# Altium integrated library 860010374011_Altium_WCAP-ATG8_rev19a.IntLib: 195 symbols (part 1 of 2)
Pins are listed as number, name and electrical type; pins without a type are passive.

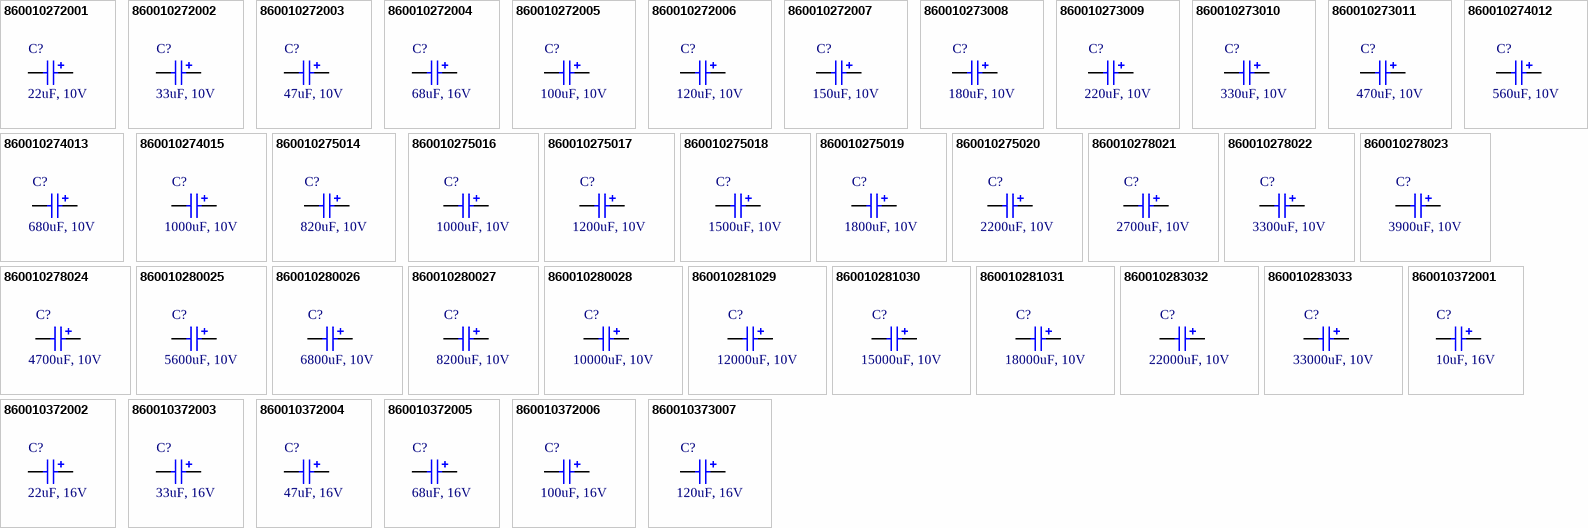
[diagram p0: symbols 860010272001 to 860010373007]

## 860010272001
designator C?, comment 22uF, 10V
WCAP-ATG8 THT Aluminum Electrolytic Capacitors, D5mm x L11mm, 22uF, +/-20%, 10VDC; Part Number: 860010272001; Dissipation Factor: 19%; Endurance: 2000h; Leakage Current: 3uA; Ripple Current max.: 66mA; Technical Reference: ATBC110220M010DSPA3B000; ComponentLink1Description: Manufacturer; ComponentLink1URL: http://www.we-online.de; ComponentLink2Description: Datasheet; ComponentLink2URL: https://katalog.we-online.com/pbs/datasheet/860010272001.pdf; Length: 11mm; Mounting Technology: THT; Operating Temperature: -40 to +85degC; Packaging: Ammo Pack; Published Date: August 2019; Capacitance: 22uF; Diameter: 5mm; Publisher: Wurth Elektronik; Capacitance Tolerance: +/-20%; Rated Voltage: 10VDC
footprint WCAP-ATG8_5x11
pins: 1 N, 2 P

## 860010272002
designator C?, comment 33uF, 10V
WCAP-ATG8 THT Aluminum Electrolytic Capacitors, D5mm x L11mm, 33uF, +/-20%, 10VDC; Part Number: 860010272002; Dissipation Factor: 19%; Endurance: 2000h; Leakage Current: 3.3uA; Ripple Current max.: 88mA; Technical Reference: ATBC110330M010DSPA3B000; ComponentLink1Description: Manufacturer; ComponentLink1URL: http://www.we-online.de; ComponentLink2Description: Datasheet; ComponentLink2URL: https://katalog.we-online.com/pbs/datasheet/860010272002.pdf; Length: 11mm; Mounting Technology: THT; Operating Temperature: -40 to +85degC; Packaging: Ammo Pack; Published Date: August 2019; Capacitance: 33uF; Diameter: 5mm; Publisher: Wurth Elektronik; Capacitance Tolerance: +/-20%; Rated Voltage: 10VDC
footprint WCAP-ATG8_5x11
pins: 1 N, 2 P

## 860010272003
designator C?, comment 47uF, 10V
WCAP-ATG8 THT Aluminum Electrolytic Capacitors, D5mm x L11mm, 47uF, +/-20%, 10VDC; Part Number: 860010272003; Dissipation Factor: 19%; Endurance: 2000h; Leakage Current: 4.7uA; Ripple Current max.: 105mA; Technical Reference: ATBC110470M010DSPA3B000; ComponentLink1Description: Manufacturer; ComponentLink1URL: http://www.we-online.de; ComponentLink2Description: Datasheet; ComponentLink2URL: https://katalog.we-online.com/pbs/datasheet/860010272003.pdf; Length: 11mm; Mounting Technology: THT; Operating Temperature: -40 to +85degC; Packaging: Ammo Pack; Published Date: August 2019; Capacitance: 47uF; Diameter: 5mm; Publisher: Wurth Elektronik; Capacitance Tolerance: +/-20%; Rated Voltage: 10VDC
footprint WCAP-ATG8_5x11
pins: 1 N, 2 P

## 860010272004
designator C?, comment 68uF, 16V
WCAP-ATG8 THT Aluminum Electrolytic Capacitors, D5mm x L11mm, 68uF, +/-20%, 10VDC; Part Number: 860010372005; Dissipation Factor: 16%; Endurance: 2000h; Leakage Current: 10.88uA; Ripple Current max.: 149mA; Rated Voltage: 16VDC; Technical Reference: ATBC110680M016DSPA3B000; ComponentLink1Description: Manufacturer; ComponentLink1URL: http://www.we-online.de; ComponentLink2Description: Datasheet; ComponentLink2URL: https://katalog.we-online.com/pbs/datasheet/860010372005.pdf; Length: 11mm; Mounting Technology: THT; Operating Temperature: -40 to +85degC; Packaging: Ammo Pack; Published Date: August 2019; Capacitance: 68uF; Diameter: 5mm; Publisher: Wurth Elektronik; Capacitance Tolerance: +/-20%
footprint WCAP-ATG8_5x11
pins: 1 N, 2 P

## 860010272005
designator C?, comment 100uF, 10V
WCAP-ATG8 THT Aluminum Electrolytic Capacitors, D5mm x L11mm, 100uF, +/-20%, 10VDC; Part Number: 860010272005; Dissipation Factor: 19%; Endurance: 2000h; Leakage Current: 10uA; Ripple Current max.: 198mA; Technical Reference: ATBC110101M010DSPA3B000; ComponentLink1Description: Manufacturer; ComponentLink1URL: http://www.we-online.de; ComponentLink2Description: Datasheet; ComponentLink2URL: https://katalog.we-online.com/pbs/datasheet/860010272005.pdf; Length: 11mm; Mounting Technology: THT; Operating Temperature: -40 to +85degC; Packaging: Ammo Pack; Published Date: August 2019; Capacitance: 100uF; Diameter: 5mm; Publisher: Wurth Elektronik; Capacitance Tolerance: +/-20%; Rated Voltage: 10VDC
footprint WCAP-ATG8_5x11
pins: 1 N, 2 P

## 860010272006
designator C?, comment 120uF, 10V
WCAP-ATG8 THT Aluminum Electrolytic Capacitors, D5mm x L11mm, 120uF, +/-20%, 10VDC; Part Number: 860010272006; Dissipation Factor: 19%; Endurance: 2000h; Leakage Current: 12uA; Ripple Current max.: 209mA; Technical Reference: ATBC110121M010DSPA3B000; ComponentLink1Description: Manufacturer; ComponentLink1URL: http://www.we-online.de; ComponentLink2Description: Datasheet; ComponentLink2URL: https://katalog.we-online.com/pbs/datasheet/860010272006.pdf; Length: 11mm; Mounting Technology: THT; Operating Temperature: -40 to +85degC; Packaging: Ammo Pack; Published Date: August 2019; Capacitance: 120uF; Diameter: 5mm; Publisher: Wurth Elektronik; Capacitance Tolerance: +/-20%; Rated Voltage: 10VDC
footprint WCAP-ATG8_5x11
pins: 1 N, 2 P

## 860010272007
designator C?, comment 150uF, 10V
WCAP-ATG8 THT Aluminum Electrolytic Capacitors, D5mm x L11mm, 150uF, +/-20%, 10VDC; Part Number: 860010272007; Dissipation Factor: 19%; Endurance: 2000h; Leakage Current: 15uA; Ripple Current max.: 231mA; Technical Reference: ATBC110151M010DSPA3B000; ComponentLink1Description: Manufacturer; ComponentLink1URL: http://www.we-online.de; ComponentLink2Description: Datasheet; ComponentLink2URL: https://katalog.we-online.com/pbs/datasheet/860010272007.pdf; Length: 11mm; Mounting Technology: THT; Operating Temperature: -40 to +85degC; Packaging: Ammo Pack; Published Date: August 2019; Capacitance: 150uF; Diameter: 5mm; Publisher: Wurth Elektronik; Capacitance Tolerance: +/-20%; Rated Voltage: 10VDC
footprint WCAP-ATG8_5x11
pins: 1 N, 2 P

## 860010273008
designator C?, comment 180uF, 10V
WCAP-ATG8 THT Aluminum Electrolytic Capacitors, D6.3mm x L11mm, 180uF, +/-20%, 10VDC; Part Number: 860010273008; Dissipation Factor: 19%; Endurance: 2000h; Leakage Current: 18uA; Ripple Current max.: 253mA; Technical Reference: ATBD110181M010DSPA4B000; ComponentLink1Description: Manufacturer; ComponentLink1URL: http://www.we-online.de; ComponentLink2Description: Datasheet; ComponentLink2URL: https://katalog.we-online.com/pbs/datasheet/860010273008.pdf; Length: 11mm; Mounting Technology: THT; Operating Temperature: -40 to +85degC; Packaging: Ammo Pack; Published Date: August 2019; Capacitance: 180uF; Diameter: 6.3mm; Publisher: Wurth Elektronik; Capacitance Tolerance: +/-20%; Rated Voltage: 10VDC
footprint WCAP-ATG8_6.3x11
pins: 1 N, 2 P

## 860010273009
designator C?, comment 220uF, 10V
WCAP-ATG8 THT Aluminum Electrolytic Capacitors, D6.3mm x L11mm, 220uF, +/-20%, 10VDC; Part Number: 860010273009; Dissipation Factor: 19%; Endurance: 2000h; Leakage Current: 22uA; Ripple Current max.: 294mA; Technical Reference: ATBD110221M010DSPA4B000; ComponentLink1Description: Manufacturer; ComponentLink1URL: http://www.we-online.de; ComponentLink2Description: Datasheet; ComponentLink2URL: https://katalog.we-online.com/pbs/datasheet/860010273009.pdf; Length: 11mm; Mounting Technology: THT; Operating Temperature: -40 to +85degC; Packaging: Ammo Pack; Published Date: August 2019; Capacitance: 220uF; Diameter: 6.3mm; Publisher: Wurth Elektronik; Capacitance Tolerance: +/-20%; Rated Voltage: 10VDC
footprint WCAP-ATG8_6.3x11
pins: 1 N, 2 P

## 860010273010
designator C?, comment 330uF, 10V
WCAP-ATG8 THT Aluminum Electrolytic Capacitors, D6.3mm x L11mm, 330uF, +/-20%, 10VDC; Part Number: 860010273010; Dissipation Factor: 19%; Endurance: 2000h; Leakage Current: 33uA; Ripple Current max.: 363mA; Technical Reference: ATBD110331M010DSPA4B000; ComponentLink1Description: Manufacturer; ComponentLink1URL: http://www.we-online.de; ComponentLink2Description: Datasheet; ComponentLink2URL: https://katalog.we-online.com/pbs/datasheet/860010273010.pdf; Length: 11mm; Mounting Technology: THT; Operating Temperature: -40 to +85degC; Packaging: Ammo Pack; Published Date: August 2019; Capacitance: 330uF; Diameter: 6.3mm; Publisher: Wurth Elektronik; Capacitance Tolerance: +/-20%; Rated Voltage: 10VDC
footprint WCAP-ATG8_6.3x11
pins: 1 N, 2 P

## 860010273011
designator C?, comment 470uF, 10V
WCAP-ATG8 THT Aluminum Electrolytic Capacitors, D6.3mm x L11mm, 470uF, +/-20%, 10VDC; Part Number: 860010273011; Dissipation Factor: 19%; Endurance: 2000h; Leakage Current: 47uA; Ripple Current max.: 418mA; Technical Reference: ATBD110471M010DSPA4B000; ComponentLink1Description: Manufacturer; ComponentLink1URL: http://www.we-online.de; ComponentLink2Description: Datasheet; ComponentLink2URL: https://katalog.we-online.com/pbs/datasheet/860010273011.pdf; Length: 11mm; Mounting Technology: THT; Operating Temperature: -40 to +85degC; Packaging: Ammo Pack; Published Date: August 2019; Capacitance: 470uF; Diameter: 6.3mm; Publisher: Wurth Elektronik; Capacitance Tolerance: +/-20%; Rated Voltage: 10VDC
footprint WCAP-ATG8_6.3x11
pins: 1 N, 2 P

## 860010274012
designator C?, comment 560uF, 10V
WCAP-ATG8 THT Aluminum Electrolytic Capacitors, D8mm x L11.5mm, 560uF, +/-20%, 10VDC; Part Number: 860010274012; Dissipation Factor: 19%; Endurance: 2000h; Leakage Current: 56uA; Ripple Current max.: 506mA; Technical Reference: ATBE115561M010DSPA7B000; ComponentLink1Description: Manufacturer; ComponentLink1URL: http://www.we-online.de; ComponentLink2Description: Datasheet; ComponentLink2URL: https://katalog.we-online.com/pbs/datasheet/860010274012.pdf; Length: 11.5mm; Mounting Technology: THT; Operating Temperature: -40 to +85degC; Packaging: Ammo Pack; Published Date: August 2019; Capacitance: 560uF; Diameter: 8mm; Publisher: Wurth Elektronik; Capacitance Tolerance: +/-20%; Rated Voltage: 10VDC
footprint WCAP-ATG8_8x11.5
pins: 1 N, 2 P

## 860010274013
designator C?, comment 680uF, 10V
WCAP-ATG8 THT Aluminum Electrolytic Capacitors, D8mm x L11.5mm, 680uF, +/-20%, 10VDC; Part Number: 860010274013; Dissipation Factor: 19%; Endurance: 2000h; Leakage Current: 68uA; Ripple Current max.: 572mA; Technical Reference: ATBE115681M010DSPA7B000; ComponentLink1Description: Manufacturer; ComponentLink1URL: http://www.we-online.de; ComponentLink2Description: Datasheet; ComponentLink2URL: https://katalog.we-online.com/pbs/datasheet/860010274013.pdf; Length: 11.5mm; Mounting Technology: THT; Operating Temperature: -40 to +85degC; Packaging: Ammo Pack; Published Date: August 2019; Capacitance: 680uF; Diameter: 8mm; Publisher: Wurth Elektronik; Capacitance Tolerance: +/-20%; Rated Voltage: 10VDC
footprint WCAP-ATG8_8x11.5
pins: 1 N, 2 P

## 860010274015
designator C?, comment 1000uF, 10V
WCAP-ATG8 THT Aluminum Electrolytic Capacitors, D8mm x L16mm, 1000uF, +/-20%, 10VDC; Part Number: 860010274015; Dissipation Factor: 19%; Endurance: 2000h; Leakage Current: 100uA; Ripple Current max.: 725mA; Technical Reference: ATBE160102M010DSPA7B000; ComponentLink1Description: Manufacturer; ComponentLink1URL: http://www.we-online.de; ComponentLink2Description: Datasheet; ComponentLink2URL: https://katalog.we-online.com/pbs/datasheet/860010274015.pdf; Length: 16mm; Mounting Technology: THT; Operating Temperature: -40 to +85degC; Packaging: Ammo Pack; Published Date: August 2019; Capacitance: 1000uF; Diameter: 8mm; Publisher: Wurth Elektronik; Capacitance Tolerance: +/-20%; Rated Voltage: 10VDC
footprint WCAP-ATG8_8x16
pins: 1 N, 2 P

## 860010275014
designator C?, comment 820uF, 10V
WCAP-ATG8 THT Aluminum Electrolytic Capacitors, D10mm x L12.5mm, 820uF, +/-20%, 10VDC; Part Number: 860010275014; Dissipation Factor: 19%; Endurance: 2000h; Leakage Current: 82uA; Ripple Current max.: 671mA; Technical Reference: ATBF125821M010DSPA9B000; ComponentLink1Description: Manufacturer; ComponentLink1URL: http://www.we-online.de; ComponentLink2Description: Datasheet; ComponentLink2URL: https://katalog.we-online.com/pbs/datasheet/860010275014.pdf; Length: 12.5mm; Mounting Technology: THT; Operating Temperature: -40 to +85degC; Packaging: Ammo Pack; Published Date: August 2019; Capacitance: 820uF; Diameter: 10mm; Publisher: Wurth Elektronik; Capacitance Tolerance: +/-20%; Rated Voltage: 10VDC
footprint WCAP-ATG8_10x12.5
pins: 1 N, 2 P

## 860010275016
designator C?, comment 1000uF, 10V
WCAP-ATG8 THT Aluminum Electrolytic Capacitors, D10mm x L12.5mm, 1000uF, +/-20%, 10VDC; Part Number: 860010274015; Dissipation Factor: 19%; Endurance: 2000h; Leakage Current: 100uA; Ripple Current max.: 725mA; Technical Reference: ATBE160102M010DSPA7B000; ComponentLink1Description: Manufacturer; ComponentLink1URL: http://www.we-online.de; ComponentLink2Description: Datasheet; ComponentLink2URL: https://katalog.we-online.com/pbs/datasheet/860010274015.pdf; Length: 16mm; Mounting Technology: THT; Operating Temperature: -40 to +85degC; Packaging: Ammo Pack; Published Date: August 2019; Capacitance: 1000uF; Diameter: 8mm; Publisher: Wurth Elektronik; Capacitance Tolerance: +/-20%; Rated Voltage: 10VDC
footprint WCAP-ATG8_10x12.5
pins: 1 N, 2 P

## 860010275017
designator C?, comment 1200uF, 10V
WCAP-ATG8 THT Aluminum Electrolytic Capacitors, D10mm x L16mm, 1200uF, +/-20%, 10VDC; Part Number: 860010275017; Dissipation Factor: 19%; Endurance: 2000h; Leakage Current: 120uA; Ripple Current max.: 902mA; Technical Reference: ATBF160122M010DSPAAB000; ComponentLink1Description: Manufacturer; ComponentLink1URL: http://www.we-online.de; ComponentLink2Description: Datasheet; ComponentLink2URL: https://katalog.we-online.com/pbs/datasheet/860010275017.pdf; Length: 16mm; Mounting Technology: THT; Operating Temperature: -40 to +85degC; Packaging: Ammo Pack; Published Date: August 2019; Capacitance: 1200uF; Diameter: 10mm; Publisher: Wurth Elektronik; Capacitance Tolerance: +/-20%; Rated Voltage: 10VDC
footprint WCAP-ATG8_10x16
pins: 1 N, 2 P

## 860010275018
designator C?, comment 1500uF, 10V
WCAP-ATG8 THT Aluminum Electrolytic Capacitors, D10mm x L16mm, 1500uF, +/-20%, 10VDC; Part Number: 860010275018; Dissipation Factor: 19%; Endurance: 2000h; Leakage Current: 150uA; Ripple Current max.: 1001mA; Technical Reference: ATBF160152M010DSPAAB000; ComponentLink1Description: Manufacturer; ComponentLink1URL: http://www.we-online.de; ComponentLink2Description: Datasheet; ComponentLink2URL: https://katalog.we-online.com/pbs/datasheet/860010275018.pdf; Length: 16mm; Mounting Technology: THT; Operating Temperature: -40 to +85degC; Packaging: Ammo Pack; Published Date: August 2019; Capacitance: 1500uF; Diameter: 10mm; Publisher: Wurth Elektronik; Capacitance Tolerance: +/-20%; Rated Voltage: 10VDC
footprint WCAP-ATG8_10x16
pins: 1 N, 2 P

## 860010275019
designator C?, comment 1800uF, 10V
WCAP-ATG8 THT Aluminum Electrolytic Capacitors, D10mm x L20mm, 1800uF, +/-20%, 10VDC; Part Number: 860010275019; Dissipation Factor: 19%; Endurance: 2000h; Leakage Current: 180uA; Ripple Current max.: 1089mA; Technical Reference: ATBF200182M010DSPAAB000; ComponentLink1Description: Manufacturer; ComponentLink1URL: http://www.we-online.de; ComponentLink2Description: Datasheet; ComponentLink2URL: https://katalog.we-online.com/pbs/datasheet/860010275019.pdf; Length: 20mm; Mounting Technology: THT; Operating Temperature: -40 to +85degC; Packaging: Ammo Pack; Published Date: August 2019; Capacitance: 1800uF; Diameter: 10mm; Publisher: Wurth Elektronik; Capacitance Tolerance: +/-20%; Rated Voltage: 10VDC
footprint WCAP-ATG8_10x20
pins: 1 N, 2 P

## 860010275020
designator C?, comment 2200uF, 10V
WCAP-ATG8 THT Aluminum Electrolytic Capacitors, D10mm x L20mm, 2200uF, +/-20%, 10VDC; Part Number: 860010275020; Dissipation Factor: 21%; Endurance: 2000h; Leakage Current: 220uA; Ripple Current max.: 1210mA; Technical Reference: ATBF200222M010DSPAAB000; ComponentLink1Description: Manufacturer; ComponentLink1URL: http://www.we-online.de; ComponentLink2Description: Datasheet; ComponentLink2URL: https://katalog.we-online.com/pbs/datasheet/860010275020.pdf; Length: 20mm; Mounting Technology: THT; Operating Temperature: -40 to +85degC; Packaging: Ammo Pack; Published Date: August 2019; Capacitance: 2200uF; Diameter: 10mm; Publisher: Wurth Elektronik; Capacitance Tolerance: +/-20%; Rated Voltage: 10VDC
footprint WCAP-ATG8_10x20
pins: 1 N, 2 P

## 860010278021
designator C?, comment 2700uF, 10V
WCAP-ATG8 THT Aluminum Electrolytic Capacitors, D13mm x L20mm, 2700uF, +/-20%, 10VDC; Part Number: 860010278021; Dissipation Factor: 21%; Endurance: 2000h; Leakage Current: 270uA; Ripple Current max.: 1419mA; Technical Reference: ATBI200272M010DSPACB000; ComponentLink1Description: Manufacturer; ComponentLink1URL: http://www.we-online.de; ComponentLink2Description: Datasheet; ComponentLink2URL: https://katalog.we-online.com/pbs/datasheet/860010278021.pdf; Length: 20mm; Mounting Technology: THT; Operating Temperature: -40 to +85degC; Packaging: Ammo Pack; Published Date: August 2019; Capacitance: 2700uF; Diameter: 13mm; Publisher: Wurth Elektronik; Capacitance Tolerance: +/-20%; Rated Voltage: 10VDC
footprint WCAP-ATG8_13x20
pins: 1 N, 2 P

## 860010278022
designator C?, comment 3300uF, 10V
WCAP-ATG8 THT Aluminum Electrolytic Capacitors, D13mm x L20mm, 3300uF, +/-20%, 10VDC; Part Number: 860010278022; Dissipation Factor: 23%; Endurance: 2000h; Leakage Current: 330uA; Ripple Current max.: 1540mA; Technical Reference: ATBI200332M010DSPACB000; ComponentLink1Description: Manufacturer; ComponentLink1URL: http://www.we-online.de; ComponentLink2Description: Datasheet; ComponentLink2URL: https://katalog.we-online.com/pbs/datasheet/860010278022.pdf; Length: 20mm; Mounting Technology: THT; Operating Temperature: -40 to +85degC; Packaging: Ammo Pack; Published Date: August 2019; Capacitance: 3300uF; Diameter: 13mm; Publisher: Wurth Elektronik; Capacitance Tolerance: +/-20%; Rated Voltage: 10VDC
footprint WCAP-ATG8_13x20
pins: 1 N, 2 P

## 860010278023
designator C?, comment 3900uF, 10V
WCAP-ATG8 THT Aluminum Electrolytic Capacitors, D13mm x L20mm, 3900uF, +/-20%, 10VDC; Part Number: 860010278023; Dissipation Factor: 23%; Endurance: 2000h; Leakage Current: 390uA; Ripple Current max.: 1760mA; Technical Reference: ATBI200392M010DSPACB000; ComponentLink1Description: Manufacturer; ComponentLink1URL: http://www.we-online.de; ComponentLink2Description: Datasheet; ComponentLink2URL: https://katalog.we-online.com/pbs/datasheet/860010278023.pdf; Length: 20mm; Mounting Technology: THT; Operating Temperature: -40 to +85degC; Packaging: Ammo Pack; Published Date: August 2019; Capacitance: 3900uF; Diameter: 13mm; Publisher: Wurth Elektronik; Capacitance Tolerance: +/-20%; Rated Voltage: 10VDC
footprint WCAP-ATG8_13x20
pins: 1 N, 2 P

## 860010278024
designator C?, comment 4700uF, 10V
WCAP-ATG8 THT Aluminum Electrolytic Capacitors, D13mm x L25mm, 4700uF, +/-20%, 10VDC; Part Number: 860010278024; Dissipation Factor: 25%; Endurance: 2000h; Leakage Current: 470uA; Ripple Current max.: 1980mA; Technical Reference: ATBI250472M010DSPACB000; ComponentLink1Description: Manufacturer; ComponentLink1URL: http://www.we-online.de; ComponentLink2Description: Datasheet; ComponentLink2URL: https://katalog.we-online.com/pbs/datasheet/860010278024.pdf; Length: 25mm; Mounting Technology: THT; Operating Temperature: -40 to +85degC; Packaging: Ammo Pack; Published Date: August 2019; Capacitance: 4700uF; Diameter: 13mm; Publisher: Wurth Elektronik; Capacitance Tolerance: +/-20%; Rated Voltage: 10VDC
footprint WCAP-ATG8_13x25
pins: 1 N, 2 P

## 860010280025
designator C?, comment 5600uF, 10V
WCAP-ATG8 THT Aluminum Electrolytic Capacitors, D16mm x L25mm, 5600uF, +/-20%, 10VDC; Part Number: 860010280025; Dissipation Factor: 27%; Endurance: 2000h; Leakage Current: 560uA; Ripple Current max.: 2189mA; Technical Reference: ATBK250562M010DSPAEB000; ComponentLink1Description: Manufacturer; ComponentLink1URL: http://www.we-online.de; ComponentLink2Description: Datasheet; ComponentLink2URL: https://katalog.we-online.com/pbs/datasheet/860010280025.pdf; Length: 25mm; Mounting Technology: THT; Operating Temperature: -40 to +85degC; Packaging: Ammo Pack; Published Date: August 2019; Capacitance: 5600uF; Diameter: 16mm; Publisher: Wurth Elektronik; Capacitance Tolerance: +/-20%; Rated Voltage: 10VDC
footprint WCAP-ATG8_16x25
pins: 1 N, 2 P

## 860010280026
designator C?, comment 6800uF, 10V
WCAP-ATG8 THT Aluminum Electrolytic Capacitors, D16mm x L25mm, 6800uF, +/-20%, 10VDC; Part Number: 860010280026; Dissipation Factor: 29%; Endurance: 2000h; Leakage Current: 680uA; Ripple Current max.: 2475mA; Technical Reference: ATBK250682M010DSPAEB000; ComponentLink1Description: Manufacturer; ComponentLink1URL: http://www.we-online.de; ComponentLink2Description: Datasheet; ComponentLink2URL: https://katalog.we-online.com/pbs/datasheet/860010280026.pdf; Length: 25mm; Mounting Technology: THT; Operating Temperature: -40 to +85degC; Packaging: Ammo Pack; Published Date: August 2019; Capacitance: 6800uF; Diameter: 16mm; Publisher: Wurth Elektronik; Capacitance Tolerance: +/-20%; Rated Voltage: 10VDC
footprint WCAP-ATG8_16x25
pins: 1 N, 2 P

## 860010280027
designator C?, comment 8200uF, 10V
WCAP-ATG8 THT Aluminum Electrolytic Capacitors, D16mm x L31.5mm, 8200uF, +/-20%, 10VDC; Part Number: 860010280027; Dissipation Factor: 33%; Endurance: 2000h; Leakage Current: 820uA; Ripple Current max.: 2541mA; Technical Reference: ATBK315822M010DSPADB000; ComponentLink1Description: Manufacturer; ComponentLink1URL: http://www.we-online.de; ComponentLink2Description: Datasheet; ComponentLink2URL: https://katalog.we-online.com/pbs/datasheet/860010280027.pdf; Length: 31.5mm; Mounting Technology: THT; Operating Temperature: -40 to +85degC; Packaging: Ammo Pack; Published Date: August 2019; Capacitance: 8200uF; Diameter: 16mm; Publisher: Wurth Elektronik; Capacitance Tolerance: +/-20%; Rated Voltage: 10VDC
footprint WCAP-ATG8_16x31.5
pins: 1 N, 2 P

## 860010280028
designator C?, comment 10000uF, 10V
WCAP-ATG8 THT Aluminum Electrolytic Capacitors, D16mm x L35.5mm, 10000uF, +/-20%, 10VDC; Part Number: 860010280028; Dissipation Factor: 37%; Endurance: 2000h; Leakage Current: 1000uA; Ripple Current max.: 2640mA; Technical Reference: ATBK355103M010DSPADB000; ComponentLink1Description: Manufacturer; ComponentLink1URL: http://www.we-online.de; ComponentLink2Description: Datasheet; ComponentLink2URL: https://katalog.we-online.com/pbs/datasheet/860010280028.pdf; Length: 35.5mm; Mounting Technology: THT; Operating Temperature: -40 to +85degC; Packaging: Ammo Pack; Published Date: August 2019; Capacitance: 10000uF; Diameter: 16mm; Publisher: Wurth Elektronik; Capacitance Tolerance: +/-20%; Rated Voltage: 10VDC
footprint WCAP-ATG8_16x35.5
pins: 1 N, 2 P

## 860010281029
designator C?, comment 12000uF, 10V
WCAP-ATG8 THT Aluminum Electrolytic Capacitors, D18mm x L35.5mm, 12000uF, +/-20%, 10VDC; Part Number: 860010281029; Dissipation Factor: 41%; Endurance: 2000h; Leakage Current: 1200uA; Ripple Current max.: 3025mA; Technical Reference: ATBL355123M010DSPAEB000; ComponentLink1Description: Manufacturer; ComponentLink1URL: http://www.we-online.de; ComponentLink2Description: Datasheet; ComponentLink2URL: https://katalog.we-online.com/pbs/datasheet/860010281029.pdf; Length: 35.5mm; Mounting Technology: THT; Operating Temperature: -40 to +85degC; Packaging: Ammo Pack; Published Date: August 2019; Capacitance: 12000uF; Diameter: 18mm; Publisher: Wurth Elektronik; Capacitance Tolerance: +/-20%; Rated Voltage: 10VDC
footprint WCAP-ATG8_18x35.5
pins: 1 N, 2 P

## 860010281030
designator C?, comment 15000uF, 10V
WCAP-ATG8 THT Aluminum Electrolytic Capacitors, D18mm x L35.5mm, 15000uF, +/-20%, 10VDC; Part Number: 860010281030; Dissipation Factor: 47%; Endurance: 2000h; Leakage Current: 1500uA; Ripple Current max.: 3310mA; Technical Reference: ATBL355153M010DSPAEB000; ComponentLink1Description: Manufacturer; ComponentLink1URL: http://www.we-online.de; ComponentLink2Description: Datasheet; ComponentLink2URL: https://katalog.we-online.com/pbs/datasheet/860010281030.pdf; Length: 35.5mm; Mounting Technology: THT; Operating Temperature: -40 to +85degC; Packaging: Ammo Pack; Published Date: August 2019; Capacitance: 15000uF; Diameter: 18mm; Publisher: Wurth Elektronik; Capacitance Tolerance: +/-20%; Rated Voltage: 10VDC
footprint WCAP-ATG8_18x35.5
pins: 1 N, 2 P

## 860010281031
designator C?, comment 18000uF, 10V
WCAP-ATG8 THT Aluminum Electrolytic Capacitors, D18mm x L41mm, 18000uF, +/-20%, 10VDC; Part Number: 860010281031; Dissipation Factor: 53%; Endurance: 2000h; Leakage Current: 1800uA; Ripple Current max.: 3410mA; Technical Reference: ATBL410183M010DSPS1B000; ComponentLink1Description: Manufacturer; ComponentLink1URL: http://www.we-online.de; ComponentLink2Description: Datasheet; ComponentLink2URL: https://katalog.we-online.com/pbs/datasheet/860010281031.pdf; Length: 41mm; Mounting Technology: THT; Operating Temperature: -40 to +85degC; Packaging: Ammo Pack; Published Date: August 2019; Capacitance: 18000uF; Diameter: 18mm; Publisher: Wurth Elektronik; Capacitance Tolerance: +/-20%; Rated Voltage: 10VDC
footprint WCAP-ATG8_18x41
pins: 1 N, 2 P

## 860010283032
designator C?, comment 22000uF, 10V
WCAP-ATG8 THT Aluminum Electrolytic Capacitors, D22mm x L41mm, 22000uF, +/-20%, 10VDC; Part Number: 860010283032; Dissipation Factor: 61%; Endurance: 2000h; Leakage Current: 2200uA; Ripple Current max.: 4092mA; Technical Reference: ATBN410223M010DSPS2B000; ComponentLink1Description: Manufacturer; ComponentLink1URL: http://www.we-online.de; ComponentLink2Description: Datasheet; ComponentLink2URL: https://katalog.we-online.com/pbs/datasheet/860010283032.pdf; Length: 41mm; Mounting Technology: THT; Operating Temperature: -40 to +85degC; Packaging: Ammo Pack; Published Date: August 2019; Capacitance: 22000uF; Diameter: 22mm; Publisher: Wurth Elektronik; Capacitance Tolerance: +/-20%; Rated Voltage: 10VDC
footprint WCAP-ATG8_22x41
pins: 1 N, 2 P

## 860010283033
designator C?, comment 33000uF, 10V
WCAP-ATG8 THT Aluminum Electrolytic Capacitors, D22mm x L51mm, 33000uF, +/-20%, 10VDC; Part Number: 860010283033; Dissipation Factor: 83%; Endurance: 2000h; Leakage Current: 3300uA; Ripple Current max.: 4620mA; Technical Reference: ATBN510333M010DSPS2B000; ComponentLink1Description: Manufacturer; ComponentLink1URL: http://www.we-online.de; ComponentLink2Description: Datasheet; ComponentLink2URL: https://katalog.we-online.com/pbs/datasheet/860010283033.pdf; Length: 51mm; Mounting Technology: THT; Operating Temperature: -40 to +85degC; Packaging: Ammo Pack; Published Date: August 2019; Capacitance: 33000uF; Diameter: 22mm; Publisher: Wurth Elektronik; Capacitance Tolerance: +/-20%; Rated Voltage: 10VDC
footprint WCAP-ATG8_22x51
pins: 1 N, 2 P

## 860010372001
designator C?, comment 10uF, 16V
WCAP-ATG8 THT Aluminum Electrolytic Capacitors, D5mm x L11mm, 10uF, +/-20%, 16VDC; Part Number: 860010372001; Dissipation Factor: 16%; Endurance: 2000h; Leakage Current: 3uA; Ripple Current max.: 44mA; Technical Reference: ATBC110100M016DSPA3B000; ComponentLink1Description: Manufacturer; ComponentLink1URL: http://www.we-online.de; ComponentLink2Description: Datasheet; ComponentLink2URL: https://katalog.we-online.com/pbs/datasheet/860010372001.pdf; Length: 11mm; Mounting Technology: THT; Operating Temperature: -40 to +85degC; Packaging: Ammo Pack; Published Date: August 2019; Capacitance: 10uF; Diameter: 5mm; Publisher: Wurth Elektronik; Capacitance Tolerance: +/-20%; Rated Voltage: 16VDC
footprint WCAP-ATG8_5x11
pins: 1 N, 2 P

## 860010372002
designator C?, comment 22uF, 16V
WCAP-ATG8 THT Aluminum Electrolytic Capacitors, D5mm x L11mm, 22uF, +/-20%, 16VDC; Part Number: 860010372002; Dissipation Factor: 16%; Endurance: 2000h; Leakage Current: 3.52uA; Ripple Current max.: 83mA; Technical Reference: ATBC110220M016DSPA3B000; ComponentLink1Description: Manufacturer; ComponentLink1URL: http://www.we-online.de; ComponentLink2Description: Datasheet; ComponentLink2URL: https://katalog.we-online.com/pbs/datasheet/860010372002.pdf; Length: 11mm; Mounting Technology: THT; Operating Temperature: -40 to +85degC; Packaging: Ammo Pack; Published Date: August 2019; Capacitance: 22uF; Diameter: 5mm; Publisher: Wurth Elektronik; Capacitance Tolerance: +/-20%; Rated Voltage: 16VDC
footprint WCAP-ATG8_5x11
pins: 1 N, 2 P
